# Altium footprint library Ultrascale_PcbLib.PcbLib: 132 footprints (part 6 of 9)
Each footprint in its own frame and in the unit in brackets; x right, y up, seen from the top. Pads: shape width x height; smd on the part's side, far side on the other; paste and mask are expansions set on the pad; w line width, h text height; cw(c..) or ccw(c..) is an arc to the next point about the centre after c.
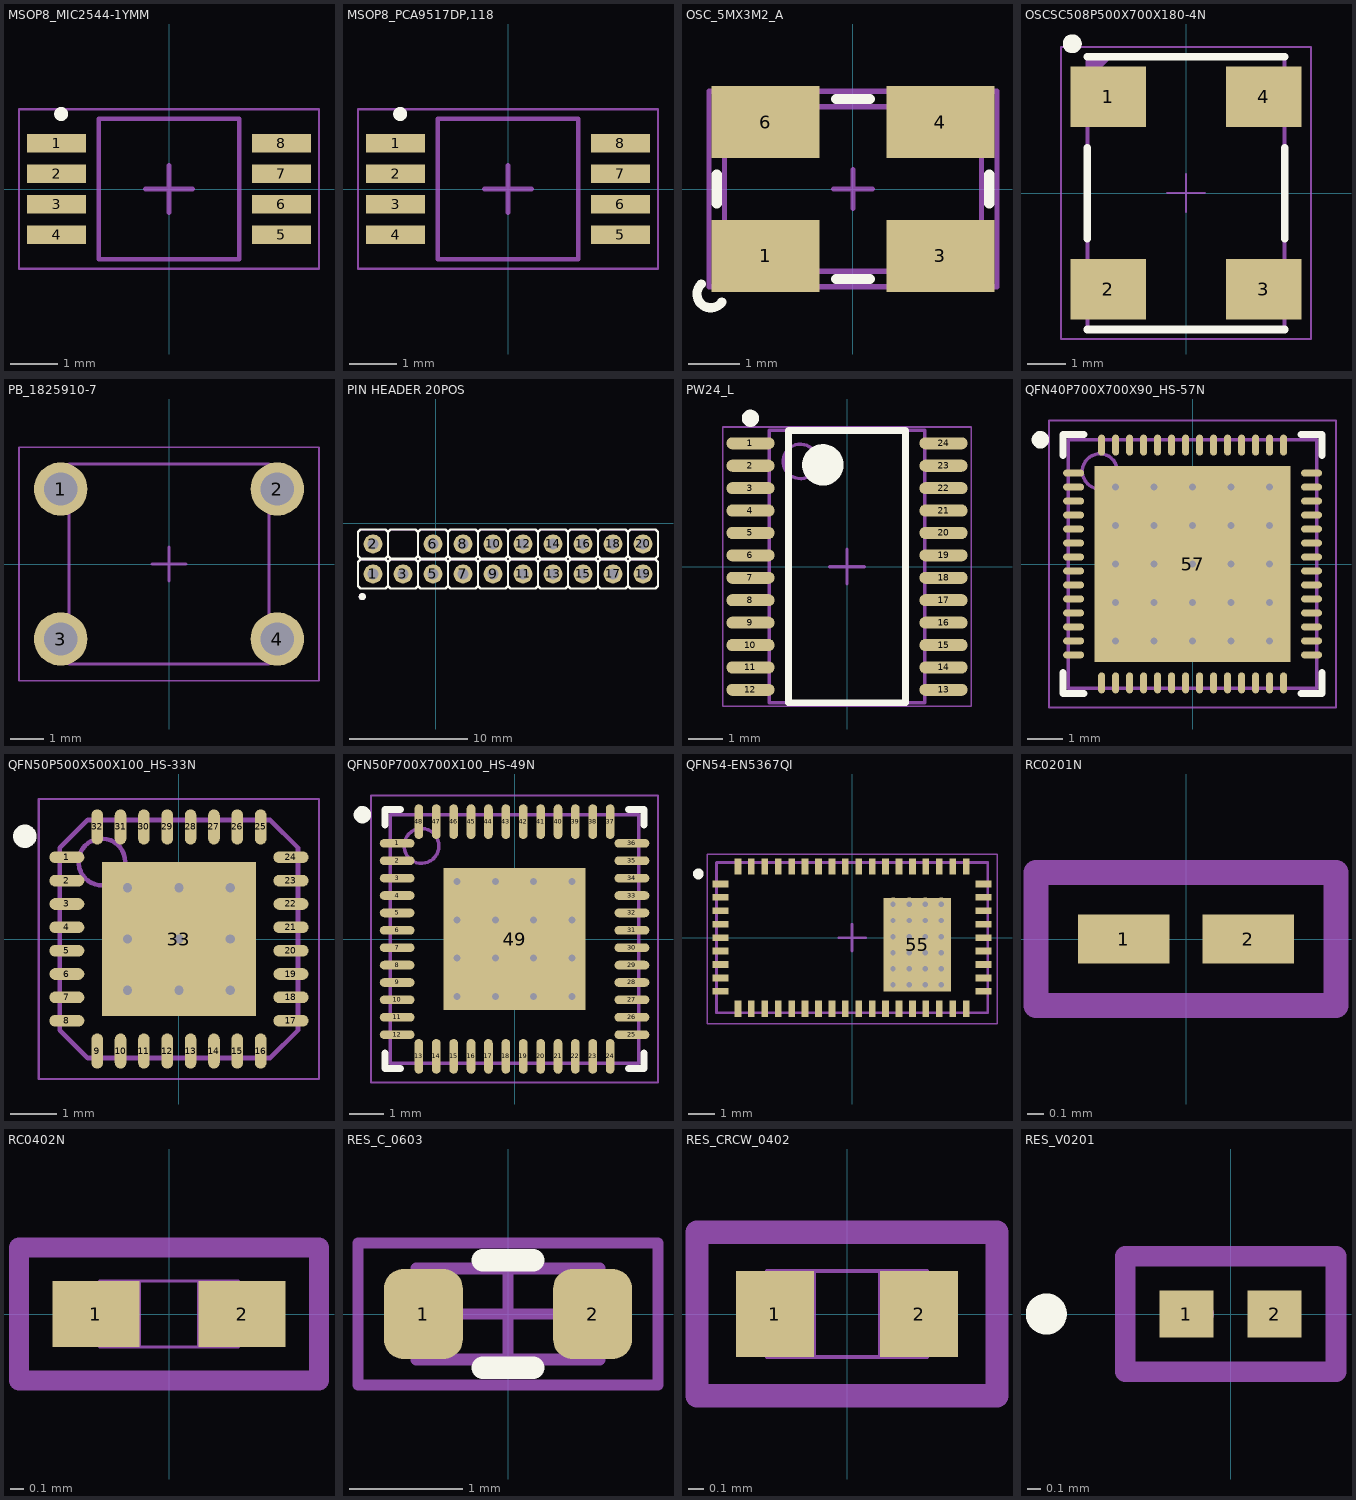
[diagram p5: the footprints below, top view; thin cyan lines are the x and y axes]

## MSOP8_MIC2544-1YMM [mm] "IC SW CURR LIMIT HI SIDE 8-MSOP"
height 1.1
pads (8):
  rect 1.26x0.4 smd mask+0.05: 1(-2.4,0.975) 2(-2.4,0.325) 3(-2.4,-0.325) 4(-2.4,-0.975) 5(2.4,-0.975) 6(2.4,-0.325) 7(2.4,0.325) 8(2.4,0.975)
Top Overlay:
  circle w0.15: c-2.3,1.6 r0.075
Mechanical 13:
  lines w0.1: -1.5,-1.5 -1.5,1.5 1.5,1.5 1.5,-1.5 -1.5,-1.5
Mechanical 15:
  lines w0.05: -3.2,-1.7 -3.2,1.7 3.2,1.7 3.2,-1.7 -3.2,-1.7
  lines w0.1: -0.5,0 0.5,0 ; 0,-0.5 0,0.5
3D body: height 1.1, standoff 0, extent -1.5,-1.5 1.5,1.5

## MSOP8_PCA9517DP,118 [mm] "IC REDRIVER I2C 1CH 8TSSOP"
height 1.1
pads (8):
  rect 1.26x0.4 smd mask+0.05: 1(-2.4,0.975) 2(-2.4,0.325) 3(-2.4,-0.325) 4(-2.4,-0.975) 5(2.4,-0.975) 6(2.4,-0.325) 7(2.4,0.325) 8(2.4,0.975)
Top Overlay:
  circle w0.15: c-2.3,1.6 r0.075
Mechanical 13:
  lines w0.1: -1.5,-1.5 1.5,-1.5 1.5,1.5 -1.5,1.5 -1.5,-1.5
Mechanical 15:
  lines w0.05: -3.2,-1.7 3.2,-1.7 3.2,1.7 -3.2,1.7 -3.2,-1.7
  lines w0.1: -0.5,0 0.5,0 ; 0,-0.5 0,0.5
3D body: height 1.1, standoff 0, extent -1.5,-1.5 1.5,1.5

## OSC_5MX3M2_A [mm] "Oscillator 5x3.2mm 6 pin, 4 physical pins (2 & 5 removed)"
height 1
pads (4):
  rrect1% 2.1x1.4 smd: 1(-1.7,-1.3) 3(1.7,-1.3) 4(1.7,1.3) 6(-1.7,1.3)
Top Overlay:
  lines w0.178: -2.95,-1.85 ccw(c-2.765,-2.042) -2.55,-2.2
  lines w0.2: -2.65,-0.275 -2.65,0.275 ; -0.325,-1.75 0.325,-1.75 ; -0.325,1.75 0.325,1.75 ; 2.65,-0.275 2.65,0.275
Mechanical 11:
  lines w0.1: -2.5,-1.6 -2.5,1.6 2.5,1.6 2.5,-1.6 -2.5,-1.6
Mechanical 13:
  lines w0.1: -2.5,-1.6 -2.5,1.6 2.5,1.6 2.5,-1.6 -2.5,-1.6
Mechanical 15:
  lines w0.1: -0.381,0 0.381,0 ; 0,-0.381 0,0.381 ; -2.8,-1.9 2.8,-1.9 2.8,1.9 -2.8,1.9 -2.8,-1.9
3D body "XTAL-OSC_5MX3M2.STEP": height 0.9, standoff -0.01, extent -2.5,-1.6 2.5,1.6

## OSCSC508P500X700X180-4N [mm] "SMD Oscillator, side convave, 4 pins, 5.00x7.00mm"
height 1.8
pads (4):
  rect 2x1.6 smd: 1(-2.05,2.54) 2(-2.05,-2.54) 3(2.05,-2.54) 4(2.05,2.54)
Top Overlay:
  circle w0.25: c-3,3.94 r0.125
  lines w0.2: -2.6,-3.6 2.6,-3.6 ; -2.6,-1.2 -2.6,1.2 ; -2.6,3.6 2.6,3.6 ; 2.6,-1.2 2.6,1.2
Mechanical 14:
  lines w0.1: -2.6,3 -2,3.6 ; -2.6,3.1 -2.1,3.6 ; -2.6,3.2 -2.2,3.6 ; -2.6,3.3 -2.3,3.6 ; -2.6,3.4 -2.4,3.6 ; -2.6,3.5 -2.5,3.6 ; -2.6,-3.6 -2.6,3.6 2.6,3.6 2.6,-3.6 -2.6,-3.6
Mechanical 15:
  lines w0.05: -0.5,0 0.5,0 ; 0,-0.5 0,0.5 ; -3.3,-3.85 3.3,-3.85 3.3,3.85 -3.3,3.85 -3.3,-3.85
3D body "OSCSC508P500X700X180-4N.stp": height 1.8, standoff 0, extent -2.6,-3.6 2.6,3.6

## PB_1825910-7 [mm]
height 5
pads (4):
  round 1.6 hole 1 mask+0.05: 1(-3.25,2.25) 2(3.25,2.25) 3(-3.25,-2.25) 4(3.25,-2.25)
Mechanical 13:
  lines w0.1: -3,-3 -3,3 3,3 3,-3 -3,-3
Mechanical 15:
  lines w0.05: -4.5,-3.5 -4.5,3.5 4.5,3.5 4.5,-3.5 -4.5,-3.5
  lines w0.1: -0.5,0 0.5,0 ; 0,-0.5 0,0.5
3D body "c-1825910-7-c-3d.stp": height 5, standoff -3.51, extent -3.9,-2.995 3.9,2.995

## PIN HEADER 20POS [mm] "TPM HEADER for TPM Module GC-TPM2.0"
pads (19):
  round 1.6 hole 0.9: 1(-5.3,-4.3) 2(-5.3,-1.76) 3(-2.76,-4.3) 5(-0.22,-4.3) 6(-0.22,-1.76) 7(2.32,-4.3) 8(2.32,-1.76) 9(4.86,-4.3) 10(4.86,-1.76) 11(7.4,-4.3) 12(7.4,-1.76) 13(9.94,-4.3) 14(9.94,-1.76) 15(12.48,-4.3) 16(12.48,-1.76) 17(15.02,-4.3) 18(15.02,-1.76) 19(17.56,-4.3) 20(17.56,-1.76)
Top Overlay:
  drawing of 151 lines, arcs and shapes, not listed
Mechanical 14:
  drawing of 151 lines, arcs and shapes, not listed
3D body "COMATEL_385.0358.1.02.400.stp": height 8, standoff -3.2, extent -6.57,-2.985 -1.49,-0.535
3D body "COMATEL_385.0358.1.02.400.stp": height 8, standoff -3.2, extent -6.57,-5.525 -1.49,-3.075
3D body "COMATEL_385.0358.1.02.400.stp": height 8, standoff -3.2, extent -1.49,-5.525 3.59,-3.075
3D body "COMATEL_385.0358.1.02.400.stp": height 8, standoff -3.2, extent -1.49,-2.985 3.59,-0.535
3D body "COMATEL_385.0358.1.02.400.stp": height 8, standoff -3.2, extent 3.59,-2.985 8.67,-0.535
3D body "COMATEL_385.0358.1.02.400.stp": height 8, standoff -3.2, extent 3.59,-5.525 8.67,-3.075
3D body "COMATEL_385.0358.1.02.400.stp": height 8, standoff -3.2, extent 8.67,-5.525 13.75,-3.075
3D body "COMATEL_385.0358.1.02.400.stp": height 8, standoff -3.2, extent 8.67,-2.985 13.75,-0.535
3D body "COMATEL_385.0358.1.02.400.stp": height 8, standoff -3.2, extent 13.75,-5.525 18.83,-3.075
3D body "COMATEL_385.0358.1.02.400.stp": height 8, standoff -3.2, extent 13.75,-2.985 18.83,-0.535

## PW24_L [mm] "TSOP, 24-Leads, Body 7.8x4.4mm, Pitch 0.65mm, IPC High Density"
height 1.2
pads (24):
  oval 1.4x0.35 smd: 1(-2.8,3.575) 2(-2.8,2.925) 3(-2.8,2.275) 4(-2.8,1.625) 5(-2.8,0.975) 6(-2.8,0.325) 7(-2.8,-0.325) 8(-2.8,-0.975) 9(-2.8,-1.625) 10(-2.8,-2.275) 11(-2.8,-2.925) 12(-2.8,-3.575) 13(2.8,-3.575) 14(2.8,-2.925) 15(2.8,-2.275) 16(2.8,-1.625) 17(2.8,-0.975) 18(2.8,-0.325) 19(2.8,0.325) 20(2.8,0.975) 21(2.8,1.625) 22(2.8,2.275) 23(2.8,2.925) 24(2.8,3.575)
Top Overlay:
  circle w0.25: c-2.8,4.3 r0.125
  circle w0.6: c-0.7,2.95 r0.3
  lines w0.2: -1.7,-3.95 -1.7,3.95 1.7,3.95 1.7,-3.95 -1.7,-3.95
Mechanical 13:
  circle w0.1: c-1.35,3.05 r0.5
  lines w0.1: -2.25,-3.95 -2.25,3.95 2.25,3.95 2.25,-3.95 -2.25,-3.95
Mechanical 15:
  lines w0.05: -3.6,-4.05 -3.6,4.05 3.6,4.05 3.6,-4.05 -3.6,-4.05
  lines w0.1: -0.5,0 0.5,0 ; 0,-0.5 0,0.5
3D body: height 1.2, standoff 0, extent -2.25,-3.95 2.25,3.95

## QFN40P700X700X90_HS-57N [mm] "QFN, 56-Leads, Body 7.00x7.00mm, Pitch 0.40mm, Thermal Pad 5.60x5.60mm, IPC Medium Density"
height 0.9
pads (57):
  oval 0.6x0.2 smd mask+0.05: 1(-3.4,2.6) 2(-3.4,2.2) 3(-3.4,1.8) 4(-3.4,1.4) 5(-3.4,1) 6(-3.4,0.6) 7(-3.4,0.2) 8(-3.4,-0.2) 9(-3.4,-0.6) 10(-3.4,-1) 11(-3.4,-1.4) 12(-3.4,-1.8) 13(-3.4,-2.2) 14(-3.4,-2.6) 29(3.4,-2.6) 30(3.4,-2.2) 31(3.4,-1.8) 32(3.4,-1.4) 33(3.4,-1) 34(3.4,-0.6) 35(3.4,-0.2) 36(3.4,0.2) 37(3.4,0.6) 38(3.4,1) 39(3.4,1.4) 40(3.4,1.8) 41(3.4,2.2) 42(3.4,2.6)
  oval 0.2x0.6 smd mask+0.05: 15(-2.6,-3.4) 16(-2.2,-3.4) 17(-1.8,-3.4) 18(-1.4,-3.4) 19(-1,-3.4) 20(-0.6,-3.4) 21(-0.2,-3.4) 22(0.2,-3.4) 23(0.6,-3.4) 24(1,-3.4) 25(1.4,-3.4) 26(1.8,-3.4) 27(2.2,-3.4) 28(2.6,-3.4) 43(2.6,3.4) 44(2.2,3.4) 45(1.8,3.4) 46(1.4,3.4) 47(1,3.4) 48(0.6,3.4) 49(0.2,3.4) 50(-0.2,3.4) 51(-0.6,3.4) 52(-1,3.4) 53(-1.4,3.4) 54(-1.8,3.4) 55(-2.2,3.4) 56(-2.6,3.4)
  rect 5.6x5.6 smd: 57(0,0)
via -2.2,2.2 diameter 0.5 hole 0.2
via -1.1,2.2 diameter 0.5 hole 0.2
via 0,2.2 diameter 0.5 hole 0.2
via 1.1,2.2 diameter 0.5 hole 0.2
via 2.2,2.2 diameter 0.5 hole 0.2
via -2.2,1.1 diameter 0.5 hole 0.2
via -1.1,1.1 diameter 0.5 hole 0.2
via 0,1.1 diameter 0.5 hole 0.2
via 1.1,1.1 diameter 0.5 hole 0.2
via 2.2,1.1 diameter 0.5 hole 0.2
via -2.2,0 diameter 0.5 hole 0.2
via -1.1,0 diameter 0.5 hole 0.2
via 0,0 diameter 0.5 hole 0.2
via 1.1,0 diameter 0.5 hole 0.2
via 2.2,0 diameter 0.5 hole 0.2
via -2.2,-1.1 diameter 0.5 hole 0.2
via -1.1,-1.1 diameter 0.5 hole 0.2
via 0,-1.1 diameter 0.5 hole 0.2
via 1.1,-1.1 diameter 0.5 hole 0.2
via 2.2,-1.1 diameter 0.5 hole 0.2
via -2.2,-2.2 diameter 0.5 hole 0.2
via -1.1,-2.2 diameter 0.5 hole 0.2
via 0,-2.2 diameter 0.5 hole 0.2
via 1.1,-2.2 diameter 0.5 hole 0.2
via 2.2,-2.2 diameter 0.5 hole 0.2
Top Overlay:
  circle w0.25: c-4.35,3.55 r0.125
  lines w0.2: -3.7,-3.1 -3.7,-3.7 -3.1,-3.7 ; -3.7,3.1 -3.7,3.7 -3.1,3.7 ; 3.1,-3.7 3.7,-3.7 3.7,-3.1 ; 3.1,3.7 3.7,3.7 3.7,3.1
Mechanical 13:
  circle w0.1: c-2.65,2.65 r0.5
  lines w0.1: -3.55,-3.55 -3.55,3.55 3.55,3.55 3.55,-3.55 -3.55,-3.55
Mechanical 15:
  lines w0.05: -4.1,-4.1 -4.1,4.1 4.1,4.1 4.1,-4.1 -4.1,-4.1
  lines w0.1: -0.5,0 0.5,0 ; 0,-0.5 0,0.5
3D body "QFN40P700X700X90_HS-57N.step": height 0.9, standoff 0, extent -3.6,-3.6 3.6,3.6

## QFN50P500X500X100_HS-33N [mm] "QFN, 32-Leads, Body 5.00x5.00mm, Pitch 0.50mm, Thermal Pad 3.30x3.30mm, IPC Medium Density"
height 1
pads (33):
  oval 0.75x0.25 smd mask+0.05: 1(-2.4,1.75) 2(-2.4,1.25) 3(-2.4,0.75) 4(-2.4,0.25) 5(-2.4,-0.25) 6(-2.4,-0.75) 7(-2.4,-1.25) 8(-2.4,-1.75) 17(2.4,-1.75) 18(2.4,-1.25) 19(2.4,-0.75) 20(2.4,-0.25) 21(2.4,0.25) 22(2.4,0.75) 23(2.4,1.25) 24(2.4,1.75)
  oval 0.25x0.75 smd mask+0.05: 9(-1.75,-2.4) 10(-1.25,-2.4) 11(-0.75,-2.4) 12(-0.25,-2.4) 13(0.25,-2.4) 14(0.75,-2.4) 15(1.25,-2.4) 16(1.75,-2.4) 25(1.75,2.4) 26(1.25,2.4) 27(0.75,2.4) 28(0.25,2.4) 29(-0.25,2.4) 30(-0.75,2.4) 31(-1.25,2.4) 32(-1.75,2.4)
  rect 3.3x3.3 smd mask+0.05: 33(0,0)
via -1.1,1.1 diameter 0.5 hole 0.2
via 1.1,-1.1 diameter 0.5 hole 0.2
via 0,-1.1 diameter 0.5 hole 0.2
via -1.1,-1.1 diameter 0.5 hole 0.2
via -1.1,0 diameter 0.5 hole 0.2
via 0,0 diameter 0.5 hole 0.2
via 1.1,0 diameter 0.5 hole 0.2
via 1.1,1.1 diameter 0.5 hole 0.2
via 0,1.1 diameter 0.5 hole 0.2
Top Overlay:
  circle w0.25: c-3.3,2.2 r0.125
Mechanical 13:
  circle w0.1: c-1.65,1.65 r0.5
  lines w0.1: -2.55,-1.95 -1.95,-2.55 1.95,-2.55 2.55,-1.95 2.55,1.95 1.95,2.55 -1.95,2.55 -2.55,1.95 -2.55,-1.95
Mechanical 15:
  lines w0.05: -3,-3 -3,3 3,3 3,-3 -3,-3
  lines w0.1: -0.5,0 0.5,0 ; 0,-0.5 0,0.5
3D body "QFN50P500X500X100_HS-33N.step": height 1, standoff 0, extent -2.6,-2.6 2.6,2.6

## QFN50P700X700X100_HS-49N [mm] "QFN, 48-Leads, Body 7.00x7.00mm, Pitch 0.50mm, Thermal Pad 4.08x4.08mm, IPC Medium Density"
height 1
pads (49):
  oval 1x0.25 smd mask+0.05: 1(-3.375,2.75) 2(-3.375,2.25) 3(-3.375,1.75) 4(-3.375,1.25) 5(-3.375,0.75) 6(-3.375,0.25) 7(-3.375,-0.25) 8(-3.375,-0.75) 9(-3.375,-1.25) 10(-3.375,-1.75) 11(-3.375,-2.25) 12(-3.375,-2.75) 25(3.375,-2.75) 26(3.375,-2.25) 27(3.375,-1.75) 28(3.375,-1.25) 29(3.375,-0.75) 30(3.375,-0.25) 31(3.375,0.25) 32(3.375,0.75) 33(3.375,1.25) 34(3.375,1.75) 35(3.375,2.25) 36(3.375,2.75)
  oval 0.25x1 smd mask+0.05: 13(-2.75,-3.375) 14(-2.25,-3.375) 15(-1.75,-3.375) 16(-1.25,-3.375) 17(-0.75,-3.375) 18(-0.25,-3.375) 19(0.25,-3.375) 20(0.75,-3.375) 21(1.25,-3.375) 22(1.75,-3.375) 23(2.25,-3.375) 24(2.75,-3.375) 37(2.75,3.375) 38(2.25,3.375) 39(1.75,3.375) 40(1.25,3.375) 41(0.75,3.375) 42(0.25,3.375) 43(-0.25,3.375) 44(-0.75,3.375) 45(-1.25,3.375) 46(-1.75,3.375) 47(-2.25,3.375) 48(-2.75,3.375)
  rect 4.08x4.08 smd mask+0.05: 49(0,0)
via 1.65,-1.65 diameter 0.5 hole 0.2
via 0.55,-1.65 diameter 0.5 hole 0.2
via -0.55,-1.65 diameter 0.5 hole 0.2
via -1.65,-1.65 diameter 0.5 hole 0.2
via 1.65,-0.55 diameter 0.5 hole 0.2
via 0.55,-0.55 diameter 0.5 hole 0.2
via -0.55,-0.55 diameter 0.5 hole 0.2
via -1.65,-0.55 diameter 0.5 hole 0.2
via 1.65,0.55 diameter 0.5 hole 0.2
via 0.55,0.55 diameter 0.5 hole 0.2
via -0.55,0.55 diameter 0.5 hole 0.2
via -1.65,0.55 diameter 0.5 hole 0.2
via 1.65,1.65 diameter 0.5 hole 0.2
via 0.55,1.65 diameter 0.5 hole 0.2
via -0.55,1.65 diameter 0.5 hole 0.2
via -1.65,1.65 diameter 0.5 hole 0.2
Top Overlay:
  circle w0.25: c-4.375,3.575 r0.125
  lines w0.2: -3.725,-3.275 -3.725,-3.725 -3.275,-3.725 ; -3.725,3.275 -3.725,3.725 -3.275,3.725 ; 3.275,-3.725 3.725,-3.725 3.725,-3.275 ; 3.275,3.725 3.725,3.725 3.725,3.275
Mechanical 13:
  circle w0.1: c-2.675,2.675 r0.5
  lines w0.1: -3.575,-3.575 3.575,-3.575 3.575,3.575 -3.575,3.575 -3.575,-3.575
Mechanical 15:
  lines w0.05: -4.125,-4.125 4.125,-4.125 4.125,4.125 -4.125,4.125 -4.125,-4.125
  lines w0.1: -0.5,0 0.5,0 ; 0,-0.5 0,0.5
3D body "RGZ0048B.stp": height 1, standoff 0, extent -3.5,-3.5 3.5,3.5

## QFN54-EN5367QI [mm] "Enpirion QFN-54 (EN5367QI)"
height 3.05
pads (55):
  rect 0.6x0.25 smd paste+0 mask+0.05: 1(-4.9,2) 2(-4.9,1.5) 3(-4.9,1) 4(-4.9,0.5) 5(-4.9,0) 6(-4.9,-0.5) 7(-4.9,-1) 8(-4.9,-1.5) 9(-4.9,-2) 28(4.9,-2) 29(4.9,-1.5) 30(4.9,-1) 31(4.9,-0.5) 32(4.9,0) 33(4.9,0.5) 34(4.9,1) 35(4.9,1.5) 36(4.9,2)
  rect 0.25x0.6 smd paste+0 mask+0.05: 10(-4.25,-2.65) 11(-3.75,-2.65) 12(-3.25,-2.65) 13(-2.75,-2.65) 14(-2.25,-2.65) 15(-1.75,-2.65) 16(-1.25,-2.65) 17(-0.75,-2.65) 18(-0.25,-2.65) 19(0.25,-2.65) 20(0.75,-2.65) 21(1.25,-2.65) 22(1.75,-2.65) 23(2.25,-2.65) 24(2.75,-2.65) 25(3.25,-2.65) 26(3.75,-2.65) 27(4.25,-2.65) 37(4.25,2.65) 38(3.75,2.65) 39(3.25,2.65) 40(2.75,2.65) 41(2.25,2.65) 42(1.75,2.65) 43(1.25,2.65) 44(0.75,2.65) 45(0.25,2.65) 46(-0.25,2.65) 47(-0.75,2.65) 48(-1.25,2.65) 49(-1.75,2.65) 50(-2.25,2.65) 51(-2.75,2.65) 52(-3.25,2.65) 53(-3.75,2.65) 54(-4.25,2.65)
  rect 2.505x3.48 smd paste-100 mask+0.05: 55(2.428,-0.26)
via 1.528,-1.76 diameter 0.5 hole 0.2
via 2.128,-1.76 diameter 0.5 hole 0.2
via 2.728,-1.76 diameter 0.5 hole 0.2
via 3.328,-1.76 diameter 0.5 hole 0.2
via 3.328,-1.16 diameter 0.6 hole 0.2
via 2.728,-1.16 diameter 0.6 hole 0.2
via 2.128,-1.16 diameter 0.6 hole 0.2
via 1.528,-1.16 diameter 0.6 hole 0.2
via 3.328,-0.56 diameter 0.6 hole 0.2
via 2.728,-0.56 diameter 0.6 hole 0.2
via 2.128,-0.56 diameter 0.6 hole 0.2
via 1.528,-0.56 diameter 0.6 hole 0.2
via 3.328,0.04 diameter 0.6 hole 0.2
via 2.728,0.04 diameter 0.6 hole 0.2
via 2.128,0.04 diameter 0.6 hole 0.2
via 1.528,0.04 diameter 0.6 hole 0.2
via 3.328,0.64 diameter 0.6 hole 0.2
via 2.728,0.64 diameter 0.6 hole 0.2
via 2.128,0.64 diameter 0.6 hole 0.2
via 1.528,0.64 diameter 0.6 hole 0.2
via 3.328,1.24 diameter 0.5 hole 0.2
via 2.728,1.24 diameter 0.5 hole 0.2
via 2.128,1.24 diameter 0.5 hole 0.2
via 1.528,1.24 diameter 0.5 hole 0.2
Top Overlay:
  lines w0.3: -5.69,2.41 ccw(c-5.725,2.375) -5.675,2.375
Top Paste:
  rectangle: 1.805,-1.45 3.055,-0.4
  rectangle: 1.805,-0.1 3.055,0.95
Mechanical 13:
  lines w0.1: -5.05,-2.8 -5.05,2.8 5.05,2.8 5.05,-2.8 -5.05,-2.8
  text "Keepout" at -4,0.95 h0.7
Mechanical 15:
  lines w0.05: -5.4,-3.2 -5.4,3.1 5.4,3.1 5.4,-3.2 -5.4,-3.2
  lines w0.1: -0.5,0 0.5,0 ; 0,-0.5 0,0.5
3D body: height 3.05, standoff 0, extent -5.05,-2.8 5.05,2.8
3D body: height 3.06, standoff 3.05, extent -4.6,1.75 -4.1,2.25

## RC0201N [mm]
pads (2):
  rect 0.556x0.3 smd: 1(-0.378,0) 2(0.378,0)
Mechanical 15:
  lines w0.152: -0.91,-0.404 -0.91,0.404 0.91,0.404 0.91,-0.404 -0.91,-0.404
3D body "RC0201N.step": height 0.71, standoff 0, extent -0.3,-0.15 0.3,0.15

## RC0402N [mm]
pads (2):
  rect 0.656x0.5 smd paste+0 mask+0: 1(-0.553,0) 2(0.553,0)
Mechanical 13:
  lines w0.025: -0.525,-0.25 -0.525,0.25 ; -0.525,-0.25 0.525,-0.25 ; -0.525,-0.25 -0.225,-0.25 -0.225,0.25 -0.525,0.25 ; -0.525,-0.25 -0.525,0.25 ; -0.525,0.25 0.525,0.25 ; 0.525,-0.25 0.525,0.25 ; 0.525,-0.25 0.525,0.25 ; 0.525,-0.25 0.225,-0.25 0.225,0.25 0.525,0.25
Mechanical 15:
  lines w0.152: -1.135,-0.504 1.135,-0.504 1.135,0.504 -1.135,0.504 -1.135,-0.504
3D body "RC0402N.step": height 0.71, standoff 0, extent -0.525,-0.25 0.525,0.25

## RES_C_0603 [mm] "Chip Resistor, 2-Leads, Body 1.6x0.8mm, IPC Medium Density"
height 0.45
pads (2):
  rrect50% 0.7x0.8 smd: 1(-0.75,0) 2(0.75,0)
Top Overlay:
  lines w0.2: -0.225,-0.475 0.225,-0.475 ; -0.225,0.475 0.225,0.475
Mechanical 11:
  lines w0.1: -0.813,-0.406 0.813,-0.406 0.813,0.406 -0.813,0.406 -0.813,-0.406
Mechanical 13:
  lines w0.1: -0.8,-0.4 0.8,-0.4 0.8,0.4 -0.8,0.4 -0.8,-0.4
Mechanical 15:
  lines w0.1: -0.4,0 0.4,0 ; 0,-0.4 0,0.4 ; -1.33,-0.63 -1.33,0.63 1.33,0.63 1.33,-0.63 -1.33,-0.63
3D body "RESISTOR-0603.STEP": height 0.45, standoff -0.01, extent -0.8,-0.4 0.8,0.4

## RES_CRCW_0402 [mil] "RES SMD 18.2K OHM 1% 1/16W 0402"
pads (2):
  rect 20x22 smd paste+0 mask+0: 1(-18.5,0) 2(18.5,0)
Mechanical 13:
  lines w1: -20.5,-11 -20.5,11 ; -20.5,-11 20.5,-11 ; -20.5,-11 -8.5,-11 -8.5,11 -20.5,11 ; -20.5,-11 -20.5,11 ; -20.5,11 20.5,11 ; 20.5,-11 20.5,11 ; 20.5,-11 20.5,11 ; 20.5,-11 8.5,-11 8.5,11 20.5,11
Mechanical 15:
  lines w6: -38.5,-21 38.5,-21 38.5,21 -38.5,21 -38.5,-21
3D body "RES_CRCW_0402.step": height 15.98, standoff 0, extent -20.51,-10.98 20.51,10.98

## RES_V0201 [mm]
pads (2):
  rect 0.403x0.35 smd: 1(-0.327,0) 2(0.327,0)
Top Overlay:
  circle w0.152: c-1.366,0 r0.076
Mechanical 13:
  circle w0: c-0.2,0 r0.076
Mechanical 15:
  lines w0.152: -0.782,-0.429 0.782,-0.429 0.782,0.429 -0.782,0.429 -0.782,-0.429
3D body "RES_V0201.step": height 0.28, standoff 0, extent -0.325,-0.175 0.325,0.175